# Altium footprint library c3_PcbLib.PcbLib: 222 footprints (part 13 of 14)
Each footprint in its own frame and in the unit in brackets; x right, y up, seen from the top. Pads: shape width x height; smd on the part's side, far side on the other; paste and mask are expansions set on the pad; w line width, h text height; cw(c..) or ccw(c..) is an arc to the next point about the centre after c.
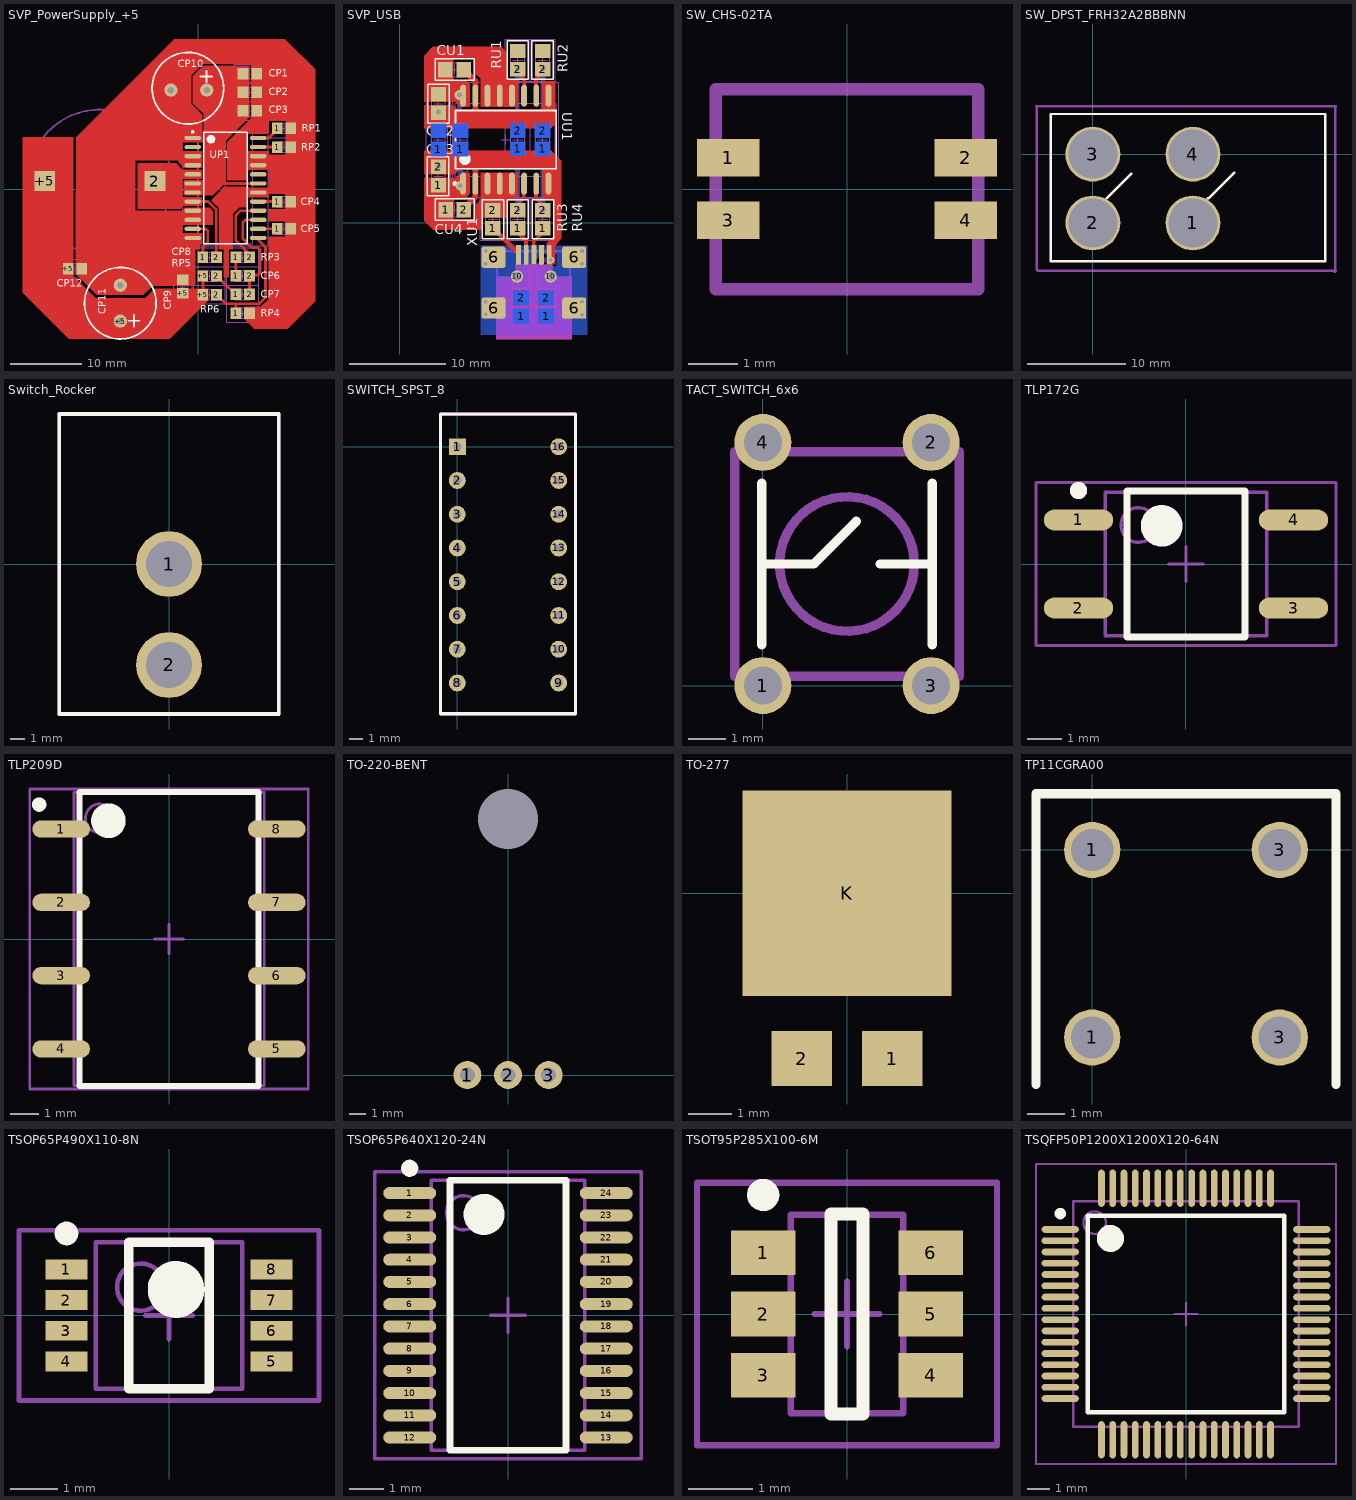
[diagram p12: the footprints below, top view; thin cyan lines are the x and y axes]

## SVP_PowerSupply_+5 [mm]
pads (62):
  rect 1.5x1.6 smd: 1(0.625,-9.474) 1(5.248,-17.272) 1(5.248,-14.656) 1(5.248,-12.065) 1(5.248,-9.474) 1(11.013,-5.512) 1(11.013,-1.702) 1(11.013,5.918) 1(11.013,8.534) 2(2.525,-14.681) 2(2.525,-12.09) 2(2.525,-9.474) 2(7.148,-14.656) 2(7.148,-12.065) 2(7.148,-9.474) +5(-18.171,-11.049) +5(0.625,-14.681) +5(0.625,-12.09) +12P(6.238,10.973) +12P(6.238,13.564) +12P(6.238,16.154) AGND(-16.271,-11.049) AGND(7.148,-17.272) AGND(8.138,10.973) AGND(8.138,13.564) AGND(8.138,16.154) AGND(12.913,-5.512) AGND(12.913,-1.702) AGND(12.913,5.918) AGND(12.913,8.534)
  rect 2.92x2.79 smd: 2(-6.082,1.143) +5(-21.452,1.143)
  oval 2.3x0.6 smd: 2(-0.79,5.918) 5(-0.79,2.108) 8(-0.79,-1.702) 11(-0.79,-5.512) 13(8.36,-6.782) 14(8.36,-5.512) 15(8.36,-4.242) 16(8.36,-2.972) 17(8.36,-1.702) 20(8.36,2.108) 23(8.36,5.918) 24(8.36,7.188) +12P(-0.79,-0.432) +12P(-0.79,0.838) +12P(8.36,0.838) AGND(-0.79,-6.782) AGND(-0.79,-4.242) AGND(-0.79,-2.972) AGND(-0.79,3.378) AGND(-0.79,4.648) AGND(-0.79,7.188) AGND(8.36,-0.432) AGND(8.36,3.378) AGND(8.36,4.648)
  round 1.85 hole 0.9: +5(-10.897,-18.39) +12P(1.168,13.868) AGND(-10.897,-13.39) AGND(-3.832,13.868)
  rect 1.6x1.5 smd: +5(-2.159,-14.514) AGND(-2.159,-12.614)
Top Layer:
  rectangle: 12.167,4.724 16.332,10.185
  region: -17.094,-11.806 -17.094,-7.569 -17.046,7.313 -3.353,21.006 12.09,21.006 16.332,16.789 16.332,9.601 9.83,9.601 9.83,7.925 9.652,7.772 6.909,7.772 6.909,5.334 9.83,5.334 9.83,4.826 16.332,4.826 16.307,-15.646 12.471,-19.482 7.798,-19.482 6.401,-18.085 6.401,-16.408 8.738,-16.408 9.83,-15.316 9.83,-6.604 12.167,-6.604 12.167,-4.445 9.83,-4.445 9.83,-2.769 12.167,-2.769 12.167,-0.635 9.83,-0.635 9.83,-1.118 6.909,-1.118 6.909,-2.515 5.69,-2.515 4.775,-3.429 4.775,-8.382 4.216,-8.382 4.216,-12.294 3.556,-12.294 3.556,-8.382 2.946,-8.382 2.946,-2.616 1.803,-1.499 3.683,0.381 6.909,0.381 6.909,0.254 9.83,0.254 9.83,2.718 6.909,2.718 6.909,1.295 4.064,1.295 4.064,6.604 7.391,9.931 7.391,17.526 0.533,17.526 -1.016,15.977 -1.016,11.938 0.508,10.363 0.508,6.553 -2.286,6.553 -2.286,5.334 0.508,5.334 0.508,3.023 -2.032,3.023 -2.935,4.089 -8.814,4.089 -8.814,-2.972 -2.286,-2.972 -1.905,-2.591 1.575,-2.591 2.032,-3.023 2.032,-4.902 -2.261,-4.902 -2.286,-4.877 -2.286,-6.096 0.508,-6.096 0.508,-7.442 0.203,-7.747 0.203,-8.382 -0.457,-8.382 -0.457,-13.437 -6.375,-13.437 -7.68,-14.694 -12.776,-14.681 -14.166,-14.681
  region: -2.489,-2.692 -2.176,-2.3 0.45,-2.3 0.45,-1.092 -2.286,-1.092 -2.286,1.524 0.508,1.524 0.508,2.769 -2.262,2.769 -2.503,3.012
  region: 7.087,17.272 7.112,10.084 3.81,6.782 3.81,0.991 2.007,-0.813 -2.032,-0.813 -2.032,1.27 0.762,1.27 0.762,10.541 -0.762,12.065 -0.762,15.799 0.66,17.272
  region: -2.464,2.972 -3.124,3.632 -8.433,3.632 -8.433,-2.692 -2.489,-2.692 -2.489,2.946
  region: -17.475,7.315 -24.536,7.315 -24.536,-14.453 -18.136,-20.853 -4.013,-20.853 1.372,-15.469 1.372,-13.894 -6.121,-13.894 -7.442,-15.215 -14.326,-15.215 -17.475,-12.065
  lines w0.254: 6.604,-8.915 6.604,-8.941 6.706,-8.941
  lines w0.381: -0.178,-6.731 -0.102,-6.807 ; -0.178,-5.486 0.965,-5.486 1.321,-5.842 1.321,-7.366 0.66,-8.026 0.66,-9.398 ; -0.051,0.838 8.357,0.838 ; 0.025,-1.676 1.346,-1.676 2.489,-2.819 2.489,-9.398 ; 0.635,-14.707 0.635,-12.116 ; 2.743,-14.91 3.785,-15.951 8.509,-15.951 9.373,-15.088 9.373,-8.077 8.103,-6.807 ; 2.972,-12.471 4.813,-14.313 ; 5.232,-17.196 5.232,-15.951 ; 5.232,-11.963 5.232,-9.728 ; 7.01,-9.068 7.01,-8.915 5.232,-7.137 5.232,-3.607 5.867,-2.972 8.407,-2.972 ; 7.137,-14.605 7.137,-12.421 ; 7.366,-11.963 8.357,-11.963 8.636,-11.684 8.636,-8.433 8.331,-8.128 7.442,-8.128 6.198,-6.883 6.198,-4.597 6.553,-4.242 7.645,-4.242 ; 9.195,-1.702 10.541,-1.702 ; 9.246,-5.512 10.643,-5.512 ; 9.246,5.918 10.668,5.918 ; 9.246,7.188 9.83,7.188 10.77,8.128
Top Overlay:
  circle w0.254: c-1.459,14.122 r5
  circle w0.254: c-10.897,-15.89 r5
  circle w0.6: c1.76,7.003 r0.3
  circle w0.25: c-0.79,8.038 r0.125
  lines w0.2: 0.76,-7.597 6.81,-7.597 6.81,8.003 0.76,8.003 0.76,-7.597
  lines w0.254: -9.779,-18.339 -8.204,-18.339 ; -8.992,-19.152 -8.992,-17.526 ; 0.305,15.773 1.93,15.773 ; 1.118,14.986 1.118,16.561
  text "CP9" at -3.759,-16.789 h1.02
  text "CP1" at 9.83,15.748 h1.02
  text "CP2" at 9.83,13.132 h1.02
  text "CP3" at 9.83,10.617 h1.02
  text "CP4" at 14.326,-2.21 h1.02
  text "CP5" at 14.326,-5.994 h1.02
  text "CP6" at 8.687,-12.522 h1.02
  text "CP7" at 8.687,-15.138 h1.02
  text "CP8" at -3.734,-9.22 h1.02
  text "CP10" at -2.896,17.094 h1.02
  text "CP11" at -12.929,-17.45 h1.02
  text "UP1" at 1.6,4.318 h1.02
  text "RP1" at 14.402,8.077 h1.02
  text "RP2" at 14.376,5.385 h1.02
  text "RP3" at 8.712,-9.957 h1.02
  text "RP4" at 8.738,-17.805 h1.02
  text "RP5" at -3.734,-10.77 h1.02
  text "RP6" at 0.229,-17.196 h1.02
  text "CP12" at -19.812,-13.589 h1.02
Mechanical 13:
  circle w0.1: c0.935,7.053 r0.5
  circle w0.254: c-13.767,1.143 r10
  lines w0.1: -18.321,-11.774 -18.321,-10.324 -16.121,-10.324 -16.121,-11.774 -18.321,-11.774 ; -2.884,-14.664 -2.884,-12.464 -1.434,-12.464 -1.434,-14.664 -2.884,-14.664 ; -0.015,-7.597 7.585,-7.597 7.585,8.003 -0.015,8.003 -0.015,-7.597 ; 0.475,-15.406 0.475,-13.956 2.675,-13.956 2.675,-15.406 0.475,-15.406 ; 0.475,-12.815 0.475,-11.365 2.675,-11.365 2.675,-12.815 0.475,-12.815 ; 0.475,-10.199 0.475,-8.749 2.675,-8.749 2.675,-10.199 0.475,-10.199 ; 5.098,-17.997 5.098,-16.547 7.298,-16.547 7.298,-17.997 5.098,-17.997 ; 5.098,-15.381 5.098,-13.931 7.298,-13.931 7.298,-15.381 5.098,-15.381 ; 5.098,-12.79 5.098,-11.34 7.298,-11.34 7.298,-12.79 5.098,-12.79 ; 5.098,-10.199 5.098,-8.749 7.298,-8.749 7.298,-10.199 5.098,-10.199 ; 6.088,10.248 6.088,11.698 8.288,11.698 8.288,10.248 6.088,10.248 ; 6.088,12.839 6.088,14.289 8.288,14.289 8.288,12.839 6.088,12.839 ; 6.088,15.429 6.088,16.879 8.288,16.879 8.288,15.429 6.088,15.429 ; 10.863,-6.237 10.863,-4.787 13.063,-4.787 13.063,-6.237 10.863,-6.237 ; 10.863,-2.427 10.863,-0.977 13.063,-0.977 13.063,-2.427 10.863,-2.427 ; 10.863,5.193 10.863,6.643 13.063,6.643 13.063,5.193 10.863,5.193 ; 10.863,7.809 10.863,9.259 13.063,9.259 13.063,7.809 10.863,7.809
Mechanical 15:
  lines w0.1: -17.721,-11.049 -16.721,-11.049 ; -17.221,-11.549 -17.221,-10.549 ; -2.659,-13.564 -1.659,-13.564 ; -2.159,-14.064 -2.159,-13.064 ; 1.075,-14.681 2.075,-14.681 ; 1.075,-12.09 2.075,-12.09 ; 1.075,-9.474 2.075,-9.474 ; 1.575,-15.181 1.575,-14.181 ; 1.575,-12.59 1.575,-11.59 ; 1.575,-9.974 1.575,-8.974 ; 3.285,0.203 4.285,0.203 ; 3.785,-0.297 3.785,0.703 ; 5.698,-17.272 6.698,-17.272 ; 5.698,-14.656 6.698,-14.656 ; 5.698,-12.065 6.698,-12.065 ; 5.698,-9.474 6.698,-9.474 ; 6.198,-17.772 6.198,-16.772 ; 6.198,-15.156 6.198,-14.156 ; 6.198,-12.565 6.198,-11.565 ; 6.198,-9.974 6.198,-8.974 ; 6.688,10.973 7.688,10.973 ; 6.688,13.564 7.688,13.564 ; 6.688,16.154 7.688,16.154 ; 7.188,10.473 7.188,11.473 ; 7.188,13.064 7.188,14.064 ; 7.188,15.654 7.188,16.654 ; 11.463,-5.512 12.463,-5.512 ; 11.463,-1.702 12.463,-1.702 ; 11.463,5.918 12.463,5.918 ; 11.463,8.534 12.463,8.534 ; 11.963,-6.012 11.963,-5.012 ; 11.963,-2.202 11.963,-1.202 ; 11.963,5.418 11.963,6.418 ; 11.963,8.034 11.963,9.034 ; -19.421,-12.349 -19.421,-9.749 -15.021,-9.749 -15.021,-12.349 -19.421,-12.349 ; -3.459,-15.764 -3.459,-11.364 -0.859,-11.364 -0.859,-15.764 -3.459,-15.764 ; -2.19,-7.847 9.76,-7.847 9.76,8.253 -2.19,8.253 -2.19,-7.847 ; -0.625,-15.981 -0.625,-13.381 3.775,-13.381 3.775,-15.981 -0.625,-15.981 ; -0.625,-13.39 -0.625,-10.79 3.775,-10.79 3.775,-13.39 -0.625,-13.39 ; -0.625,-10.774 -0.625,-8.174 3.775,-8.174 3.775,-10.774 -0.625,-10.774 ; 3.998,-18.572 3.998,-15.972 8.398,-15.972 8.398,-18.572 3.998,-18.572 ; 3.998,-15.956 3.998,-13.356 8.398,-13.356 8.398,-15.956 3.998,-15.956 ; 3.998,-13.365 3.998,-10.765 8.398,-10.765 8.398,-13.365 3.998,-13.365 ; 3.998,-10.774 3.998,-8.174 8.398,-8.174 8.398,-10.774 3.998,-10.774 ; 4.988,9.673 4.988,12.273 9.388,12.273 9.388,9.673 4.988,9.673 ; 4.988,12.264 4.988,14.864 9.388,14.864 9.388,12.264 4.988,12.264 ; 4.988,14.854 4.988,17.454 9.388,17.454 9.388,14.854 4.988,14.854 ; 9.763,-6.812 9.763,-4.212 14.163,-4.212 14.163,-6.812 9.763,-6.812 ; 9.763,-3.002 9.763,-0.402 14.163,-0.402 14.163,-3.002 9.763,-3.002 ; 9.763,4.618 9.763,7.218 14.163,7.218 14.163,4.618 9.763,4.618 ; 9.763,7.234 9.763,9.834 14.163,9.834 14.163,7.234 9.763,7.234
3D body: height 1.24, standoff -0.03, extent 5.537,15.392 8.839,16.916
3D body: height 1.24, standoff -0.03, extent 5.537,12.802 8.839,14.326
3D body: height 1.24, standoff -0.03, extent 5.537,10.211 8.839,11.735
3D body: height 1.24, standoff -0.03, extent 10.312,-2.464 13.614,-0.94
3D body: height 1.24, standoff -0.03, extent 10.312,-6.274 13.614,-4.75
3D body: height 1.24, standoff -0.03, extent 4.547,-12.827 7.849,-11.303
3D body: height 1.24, standoff -0.03, extent 4.547,-15.418 7.849,-13.894
3D body: height 1.24, standoff -0.03, extent -2.921,-15.215 -1.397,-11.913
3D body: height 0.5, standoff -0.01, extent 10.439,7.772 13.487,9.296
3D body: height 0.5, standoff -0.01, extent 10.439,5.156 13.487,6.68
3D body: height 0.5, standoff -0.01, extent 4.674,-10.236 7.722,-8.712
3D body: height 0.5, standoff -0.01, extent 4.674,-18.034 7.722,-16.51
3D body: height 0.5, standoff -0.01, extent 0.051,-15.443 3.099,-13.919
3D body: height 0.5, standoff -0.01, extent 0.051,-12.852 3.099,-11.328
3D body: height 1.24, standoff -0.03, extent -0.076,-10.236 3.226,-8.712
3D body: height 2.57, standoff -0.03, extent -1.507,-7.595 9.093,8.005
3D body: height 1.24, standoff -0.03, extent -18.872,-11.811 -15.57,-10.287
3D body: height 12.5, standoff 0, extent -15.926,-20.853 -5.918,-10.846
3D body: height 12.5, standoff 0, extent -6.426,9.119 3.581,19.126

## SVP_USB [mm]
pads (57):
  rect 1.6x1.5 smd: 1(4.039,3.901) 1(9.703,-0.594) 1(12.294,-0.594) 1(14.91,-0.594) 2(4.039,5.801) 2(9.703,1.306) 2(12.294,1.306) 2(12.294,15.966) 2(14.884,15.966) 2(14.91,1.306) +3.3D(4.039,13.345) DGND(4.039,11.445) USB_N(12.294,17.866) USB_P(14.884,17.866)
  rect 1.6x1.5 smd far side: 1(4.039,7.661) 1(6.325,7.661) 1(12.294,7.686) 1(12.649,-9.738) 1(14.884,7.686) 1(15.24,-9.738) 2(12.294,9.586) 2(12.649,-7.838) 2(14.884,9.586) 2(15.24,-7.838) +3.3D(6.325,9.561) DGND(4.039,9.561)
  rect 1.5x1.6 smd: 1(4.79,1.346) 2(6.69,1.346) +3.3D(4.765,15.926) DGND(6.665,15.926)
  oval 0.6x2.3 smd: 1(6.604,4.061) 2(7.874,4.061) 3(9.144,4.061) 4(10.414,4.061) 5(11.684,4.061) 6(12.954,4.061) 7(14.224,4.061) 8(15.494,4.061) 10(14.224,13.211) 11(12.954,13.211) +3.3D(6.604,13.211) +3.3D(9.144,13.211) +3.3D(10.414,13.211) +3.3D(11.684,13.211) DGND(7.874,13.211) DGND(15.494,13.211)
  rect 0.5x2 smd: 1(12.37,-3.353) 2(13.17,-3.353) 3(13.97,-3.353) 4(14.77,-3.353) 5(15.57,-3.353)
  rrect20% 2.5x2.2 smd: 6(9.77,-8.903) 6(9.77,-3.603) 6(18.17,-8.903) 6(18.17,-3.603)
  round 1.27 hole 0.9: 10(12.22,-5.603) 10(15.72,-5.603)
via 6.223,13.284 diameter 1.016 hole 0.508
via 8.966,-2.946 diameter 0.762 hole 0.381
via 8.941,-4.293 diameter 0.762 hole 0.381
via 8.941,-8.23 diameter 0.762 hole 0.381
via 8.966,-9.55 diameter 0.762 hole 0.381
via 18.974,-9.576 diameter 0.762 hole 0.381
via 18.974,-8.23 diameter 0.762 hole 0.381
via 18.974,-4.267 diameter 0.762 hole 0.381
via 18.974,-2.946 diameter 0.762 hole 0.381
via 15.723,-3.886 diameter 0.762 hole 0.381
via 12.243,15.977 diameter 1.016 hole 0.508
via 14.91,15.977 diameter 1.016 hole 0.508
via 12.294,1.295 diameter 1.016 hole 0.508
via 14.91,1.321 diameter 1.016 hole 0.508
via 6.299,3.835 diameter 1.016 hole 0.508
via 4.039,5.893 diameter 1.016 hole 0.508
via 4.039,11.506 diameter 1.016 hole 0.508
Top Layer:
  region: 2.565,4.674 5.867,4.674 6.401,5.207 7.29,5.207 7.29,2.997 6.731,2.438 5.613,2.438 5.613,0.279 7.696,0.279 7.696,1.626 8.458,2.388 8.458,5.207 12.344,5.207 12.344,2.642 12.014,2.311 11.201,2.311 11.201,0.483 8.636,0.483 8.636,-0.762 3.531,-0.787 2.565,0.178
  region: 2.54,5.029 5.715,5.029 6.223,5.537 14.834,5.537 14.834,2.676 15.18,2.311 15.977,2.311 15.977,-1.448 15.291,-2.159 15.291,-4.343 16.18,-4.343 16.18,-2.413 16.84,-1.651 16.84,6.426 15.773,7.493 2.54,7.493
  region: 7.29,12.065 6.325,12.065 5.817,12.573 2.54,12.573 2.54,17.374 3.454,18.313 10.566,18.313 11.201,17.602 11.201,14.961 12.141,14.961 12.344,14.757 12.344,12.065 8.458,12.065 8.458,14.986 7.722,15.723 7.722,17.069 5.588,17.069 5.588,14.834 6.934,14.834 7.29,14.478
  region: 2.54,12.217 5.588,12.217 6.071,11.735 14.808,11.76 14.808,14.707 16.18,14.707 16.18,10.222 15.748,9.804 2.54,9.804
  lines w0.381: 12.167,-0.864 13.157,-1.854 13.157,-2.642 ; 12.344,1.956 12.929,2.54 12.929,3.353 ; 12.421,15.443 12.954,14.91 12.954,13.995 ; 13.97,-2.921 13.97,-1.93 14.935,-0.965 ; 14.199,3.454 14.199,2.54 14.961,1.778 ; 14.199,13.894 14.199,14.91 15.037,15.748
  lines w0.508: 9.906,-0.762 11.989,-2.845 12.319,-2.845
  lines w0.635: 6.807,15.799 7.874,14.732 7.874,10.744 ; 7.087,1.88 7.874,2.667 7.874,5.969
Bottom Layer:
  region: 8.433,-2.413 8.433,-11.684 19.507,-11.684 19.507,-2.413 16.358,-2.413 16.358,-4.521 15.138,-4.521 14.453,-5.207 14.453,-6.833 16.307,-6.833 16.307,-8.89 11.582,-8.89 11.582,-6.833 13.437,-6.833 13.437,-4.648 14.834,-3.251 16.358,-3.251 16.358,-2.413
  lines w0.508: 4.039,5.893 4.039,7.849 ; 4.039,9.55 4.039,11.506 ; 6.223,9.271 6.223,13.259 ; 6.299,3.835 6.299,7.722 ; 12.243,9.576 12.243,15.977 ; 12.268,1.295 12.268,7.823 ; 13.945,-7.823 13.945,-4.953 15.037,-3.861 15.723,-3.861 ; 14.91,1.321 14.91,7.823 ; 14.91,9.677 14.91,15.977
  lines w1.27: 12.598,-7.823 15.215,-7.823
Top Overlay:
  circle w0.25: c5.754,4.061 r0.125
  circle w0.6: c6.799,6.611 r0.3
  lines w0.152: 2.896,2.819 5.131,2.819 5.131,6.858 2.896,6.858 2.896,2.819 ; 2.921,10.363 5.156,10.363 5.156,14.402 2.921,14.402 2.921,10.363 ; 3.708,0.229 7.747,0.229 7.747,2.464 3.708,2.464 3.708,0.229 ; 3.708,14.808 3.708,17.043 7.747,17.043 7.747,14.808 3.708,14.808 ; 8.585,-1.676 10.82,-1.676 10.82,2.362 8.585,2.362 8.585,-1.676 ; 11.176,-1.676 13.411,-1.676 13.411,2.362 11.176,2.362 11.176,-1.676 ; 11.176,14.91 13.411,14.91 13.411,18.948 11.176,18.948 11.176,14.91 ; 13.741,14.91 15.977,14.91 15.977,18.948 13.741,18.948 13.741,14.91 ; 13.792,-1.676 16.027,-1.676 16.027,2.362 13.792,2.362 13.792,-1.676
  lines w0.2: 5.799,5.611 16.299,5.611 16.299,11.661 5.799,11.661 5.799,5.611
  text "RU1" at 10.592,16.002 h1.02
  text "RU2" at 17.501,15.646 h1.02
  text "RU3" at 17.45,-0.965 h1.02
  text "RU4" at 18.999,-0.94 h1.02
  text "CU1" at 3.861,17.45 h1.02
  text "CU2" at 2.743,9.042 h1.02
  text "CU4" at 3.658,-1.219 h1.02
  text "CU3" at 2.743,7.137 h1.02
  text "XU1" at 8.077,-2.438 h1.02
  text "UU1" at 16.942,11.481 h1.02
Bottom Overlay:
  lines w0.152: 5.182,6.579 7.417,6.579 7.417,10.617 5.182,10.617 ; 5.182,6.579 5.182,10.617 ; 5.182,6.579 2.946,6.579 2.946,10.617 5.182,10.617 ; 5.182,6.579 5.182,10.617 ; 11.176,6.604 13.411,6.604 13.411,10.643 11.176,10.643 11.176,6.604 ; 11.506,-10.846 13.741,-10.846 13.741,-6.807 11.506,-6.807 11.506,-10.846 ; 13.767,6.604 16.002,6.604 16.002,10.643 13.767,10.643 13.767,6.604 ; 14.122,-10.846 16.358,-10.846 16.358,-6.807 14.122,-6.807 14.122,-10.846
  text "RU5" at 2.565,10.008 h1.02
  text "RU6" at 8.712,10.084 h1.02
  text "RU7" at 10.77,10.084 h1.02
  text "RU8" at 17.374,10.109 h1.02
  text "CU7" at 16.637,-10.363 h1.02
  text "RU9" at 10.058,-10.236 h1.02
Mechanical 13:
  circle w0.1: c6.749,5.786 r0.5
  lines w0.1: 3.314,3.751 3.314,5.951 4.764,5.951 4.764,3.751 3.314,3.751 ; 3.314,7.511 4.764,7.511 4.764,9.711 3.314,9.711 3.314,7.511 ; 3.314,11.295 3.314,13.495 4.764,13.495 4.764,11.295 3.314,11.295 ; 4.615,15.201 4.615,16.651 6.815,16.651 6.815,15.201 4.615,15.201 ; 4.64,0.621 6.84,0.621 6.84,2.071 4.64,2.071 4.64,0.621 ; 5.6,7.511 5.6,9.711 7.05,9.711 7.05,7.511 5.6,7.511 ; 5.799,4.836 16.299,4.836 16.299,12.436 5.799,12.436 5.799,4.836 ; 8.978,-0.744 8.978,1.456 10.428,1.456 10.428,-0.744 8.978,-0.744 ; 11.569,-0.744 11.569,1.456 13.019,1.456 13.019,-0.744 11.569,-0.744 ; 11.569,7.536 11.569,9.736 13.019,9.736 13.019,7.536 11.569,7.536 ; 11.569,15.816 11.569,18.016 13.019,18.016 13.019,15.816 11.569,15.816 ; 11.924,-9.888 11.924,-7.688 13.374,-7.688 13.374,-9.888 11.924,-9.888 ; 14.159,7.536 14.159,9.736 15.609,9.736 15.609,7.536 14.159,7.536 ; 14.159,15.816 14.159,18.016 15.609,18.016 15.609,15.816 14.159,15.816 ; 14.185,-0.744 14.185,1.456 15.635,1.456 15.635,-0.744 14.185,-0.744 ; 14.515,-9.888 14.515,-7.688 15.965,-7.688 15.965,-9.888 14.515,-9.888
  lines w0.254: 10.16,-11.989 17.78,-11.989 17.78,-2.972 10.16,-2.972 10.16,-11.989
Mechanical 15:
  lines w0.1: 2.739,6.411 5.339,6.411 5.339,10.811 2.739,10.811 ; 2.739,10.195 5.339,10.195 5.339,14.595 2.739,14.595 ; 2.748,2.651 2.748,7.051 ; 2.748,6.411 2.748,10.811 ; 2.748,10.195 2.748,14.595 ; 3.539,4.851 4.539,4.851 ; 3.539,8.611 4.539,8.611 ; 3.539,12.395 4.539,12.395 ; 4.039,4.351 4.039,5.351 ; 4.039,8.111 4.039,9.111 ; 4.039,11.895 4.039,12.895 ; 5.025,6.411 5.025,10.811 ; 5.215,15.926 6.215,15.926 ; 5.24,1.346 6.24,1.346 ; 5.715,15.426 5.715,16.426 ; 5.74,0.846 5.74,1.846 ; 5.825,8.611 6.825,8.611 ; 6.325,8.111 6.325,9.111 ; 9.203,0.356 10.203,0.356 ; 9.703,-0.144 9.703,0.856 ; 10.549,8.636 11.549,8.636 ; 11.049,8.136 11.049,9.136 ; 11.794,0.356 12.794,0.356 ; 11.794,8.636 12.794,8.636 ; 11.794,16.916 12.794,16.916 ; 12.149,-8.788 13.149,-8.788 ; 12.294,-0.144 12.294,0.856 ; 12.294,8.136 12.294,9.136 ; 12.294,16.416 12.294,17.416 ; 12.649,-9.288 12.649,-8.288 ; 14.384,8.636 15.384,8.636 ; 14.384,16.916 15.384,16.916 ; 14.41,0.356 15.41,0.356 ; 14.74,-8.788 15.74,-8.788 ; 14.884,8.136 14.884,9.136 ; 14.884,16.416 14.884,17.416 ; 14.91,-0.144 14.91,0.856 ; 15.24,-9.288 15.24,-8.288 ; 2.739,2.651 2.739,7.051 5.339,7.051 5.339,2.651 2.739,2.651 ; 3.515,14.626 3.515,17.226 7.915,17.226 7.915,14.626 3.515,14.626 ; 3.54,0.046 7.94,0.046 7.94,2.646 3.54,2.646 3.54,0.046 ; 5.549,2.661 16.549,2.661 16.549,14.611 5.549,14.611 5.549,2.661 ; 8.403,-1.844 8.403,2.556 11.003,2.556 11.003,-1.844 8.403,-1.844 ; 10.994,-1.844 10.994,2.556 13.594,2.556 13.594,-1.844 10.994,-1.844 ; 10.994,6.436 10.994,10.836 13.594,10.836 13.594,6.436 10.994,6.436 ; 10.994,14.716 10.994,19.116 13.594,19.116 13.594,14.716 10.994,14.716 ; 11.349,-10.988 11.349,-6.588 13.949,-6.588 13.949,-10.988 11.349,-10.988 ; 13.584,6.436 13.584,10.836 16.184,10.836 16.184,6.436 13.584,6.436 ; 13.584,14.716 13.584,19.116 16.184,19.116 16.184,14.716 13.584,14.716 ; 13.61,-1.844 13.61,2.556 16.21,2.556 16.21,-1.844 13.61,-1.844 ; 13.94,-10.988 13.94,-6.588 16.54,-6.588 16.54,-10.988 13.94,-10.988
Mechanical 15 keep-out:
  region: 12.065,-4.369 15.875,-4.369 15.875,-5.639 17.907,-5.639 17.907,-12.116 10.033,-12.116 10.033,-5.639 12.065,-5.639
3D body: height 2.57, standoff -0.03, extent 5.842,3.336 16.342,13.936
3D body: height 0.5, standoff -0.01, extent 8.941,-1.168 10.465,1.88
3D body: height 0.5, standoff -0.01, extent 11.887,-10.262 13.411,-7.214
3D body: height 0.5, standoff -0.01, extent 5.563,7.087 7.087,10.135
3D body: height 0.5, standoff -0.01, extent 3.277,7.087 4.801,10.135
3D body: height 0.5, standoff -0.01, extent 11.532,7.112 13.056,10.16
3D body: height 0.5, standoff -0.01, extent 14.122,7.112 15.646,10.16
3D body: height 0.5, standoff -0.01, extent 11.532,15.392 13.056,18.44
3D body: height 0.5, standoff -0.01, extent 14.122,15.392 15.646,18.44
3D body: height 0.5, standoff -0.01, extent 11.532,-1.168 13.056,1.88
3D body: height 0.5, standoff -0.01, extent 14.148,-1.168 15.672,1.88
3D body: height 1.24, standoff -0.03, extent 14.503,-10.541 16.027,-7.239
3D body: height 1.24, standoff -0.03, extent 4.089,0.584 7.391,2.108
3D body: height 1.24, standoff -0.03, extent 4.064,15.164 7.366,16.688
3D body: height 1.24, standoff -0.03, extent 3.277,3.2 4.801,6.502
3D body: height 1.24, standoff -0.03, extent 3.277,10.744 4.801,14.046
3D body: height 4.12, standoff -0.97, extent 8.998,-11.839 18.898,-2.639

## SW_CHS-02TA [mil]
pads (4):
  rect 50x30 smd: 1(-95,25) 2(95,25) 3(-95,-25) 4(95,-25)
Mechanical 13:
  lines w10: -105,-80 105,-80 105,80 -105,80 -105,-80
3D body: height 98.43, standoff 0, extent -104.98,-79.98 104.98,79.98

## SW_DPST_FRH32A2BBBNN [mil]
pads (4):
  round 220 hole 197: 1(402,-276) 2(0,-276) 3(0,0) 4(402,0)
Top Overlay:
  lines w10: 55.12,-177.17 153.54,-78.74 ; 460.63,-177.17 464.57,-177.17 566.93,-74.8 ; -169.29,-429.13 -169.29,161.42 -153.54,161.42 933.07,161.42 933.07,-429.13 -169.29,-429.13
Mechanical 15:
  lines w10: -228.35,192.91 -177.17,192.91 ; -224.41,192.91 -224.41,-464.57 -220.47,-468.5 618.11,-468.5 ; -188.98,192.91 618.11,192.91 ; 602.36,-468.5 976.38,-468.5 ; 602.36,192.91 976.38,192.91 972.44,188.98 972.44,-472.44 968.5,-468.5

## Switch_Rocker [mil]
pads (2):
  round 180 hole 125: 1(0,0) 2(0,-276)
Top Overlay:
  lines w10: -300,-410 -300,410 300,410 300,-410 -300,-410
Mechanical 13:
  lines w10: -300,-410 300,-410 300,410 -300,410 -300,-410
3D body: height 600, standoff 0, extent -299.98,-409.98 299.98,409.98

## SWITCH_SPST_8 [mm]
pads (16):
  rect 1.27x1.27 hole 0.635: 1(0,0)
  round 1.27 hole 0.635: 2(0,-2.54) 3(0,-5.08) 4(0,-7.62) 5(0,-10.16) 6(0,-12.7) 7(0,-15.24) 8(0,-17.78) 9(7.62,-17.78) 10(7.62,-15.24) 11(7.62,-12.7) 12(7.62,-10.16) 13(7.62,-7.62) 14(7.62,-5.08) 15(7.62,-2.54) 16(7.62,0)
Top Overlay:
  lines w0.254: -1.27,-20.091 -1.27,2.464 8.89,2.464 8.89,-20.091 -1.27,-20.091
Mechanical 13:
  lines w0.254: -1.27,-20.117 8.89,-20.117 8.89,2.438 -1.27,2.438 -1.27,-20.117
3D body: height 8.89, standoff 0, extent -0.991,-20.041 8.661,2.438

## TACT_SWITCH_6x6 [mil]
pads (4):
  round 60 hole 40: 1(0,0) 2(177.17,255.91) 3(177.17,0) 4(0,255.91)
Top Overlay:
  lines w10: -1.42,42.95 -1.42,212.95 ; -1.42,127.95 53.58,127.95 98.58,172.95 ; 123.58,127.95 178.58,127.95 ; 178.58,42.95 178.58,212.95
Mechanical 13:
  circle w10: c88.58,127.95 r70.87
  lines w10: -29.53,9.84 -29.53,246.06 206.69,246.06 206.69,9.84 -29.53,9.84
3D body: height 169, standoff -25, extent -29,0 207,255.39

## TLP172G [mm] "SOP, 4-Leads, Body 4.2x4.7mm (max), Pitch 2.54mm, IPC Medium Density"
height 2.1
pads (4):
  oval 2x0.6 smd: 1(-3.1,1.27) 2(-3.1,-1.27) 3(3.1,-1.27) 4(3.1,1.27)
Top Overlay:
  circle w0.25: c-3.1,2.12 r0.125
  circle w0.6: c-0.7,1.1 r0.3
  lines w0.2: -1.7,-2.1 -1.7,2.1 1.7,2.1 1.7,-2.1 -1.7,-2.1
Mechanical 13:
  circle w0.1: c-1.375,1.125 r0.5
  lines w0.1: -2.325,-2.075 -2.325,2.075 2.325,2.075 2.325,-2.075 -2.325,-2.075
Mechanical 15:
  lines w0.1: -0.5,0 0.5,0 ; 0,-0.5 0,0.5 ; -4.325,-2.35 -4.325,2.35 4.325,2.35 4.325,-2.35 -4.325,-2.35
3D body: height 2.1, standoff 0.1, extent -2.325,-2.075 2.325,2.075

## TLP209D [mm]
pads (8):
  oval 2x0.6 smd: 1(-3.738,3.81) 2(-3.738,1.27) 3(-3.738,-1.27) 4(-3.738,-3.81) 5(3.738,-3.81) 6(3.738,-1.27) 7(3.738,1.27) 8(3.738,3.81)
Top Overlay:
  circle w0.6: c-2.1,4.1 r0.3
  circle w0.25: c-4.5,4.66 r0.125
  lines w0.2: -3.1,-5.1 3.1,-5.1 3.1,5.1 -3.1,5.1 -3.1,-5.1
Mechanical 13:
  circle w0.1: c-2.4,4.18 r0.5
  lines w0.1: -3.3,-5.08 3.3,-5.08 3.3,5.08 -3.3,5.08 -3.3,-5.08
Mechanical 15:
  lines w0.1: -0.5,0 0.5,0 ; 0,-0.5 0,0.5 ; -4.826,-5.2 4.826,-5.2 4.826,5.2 -4.826,5.2 -4.826,-5.2
3D body: height 4.57, standoff 0, extent -3.3,-5.08 3.3,5.08

## TO-220-BENT [mm]
pads (4):
  round 1.75 hole 0.95: 1(-2.54,0) 2(0,0) 3(2.54,0)
  round 0 hole 3.75: 7(0,16)
3D body: height 4.2, standoff -3, extent -5.105,-0.22 5.055,19.27

## TO-277 [mm]
pads (3):
  rect 1.4x1.27 smd: 1(1.04,-3.805) 2(-1.04,-3.805)
  rect 4.8x4.72 smd: K(0,0)

## TP11CGRA00 [mil] "OFF-MOM PB"
pads (4):
  round 60 hole 45: 1(0,-200) 1(0,0) 3(200,-200) 3(200,0)
Top Overlay:
  lines w10: -60,-250 -60,60 260,60 260,-250

## TSOP65P490X110-8N [mm] "TSOP, 8-Leads, Body 3.1x3.1mm (max), Pitch 0.65mm, IPC Medium Density"
height 1.1
pads (8):
  rect 0.889x0.42 smd: 1(-2.171,0.975) 2(-2.171,0.325) 3(-2.171,-0.325) 4(-2.171,-0.975) 5(2.17,-0.975) 6(2.17,-0.325) 7(2.17,0.325) 8(2.17,0.975)
Top Overlay:
  circle w0.6: c0.15,0.55 r0.3
  circle w0.25: c-2.171,1.735 r0.125
  lines w0.2: -0.85,-1.55 0.85,-1.55 0.85,1.55 -0.85,1.55 -0.85,-1.55
Mechanical 13:
  circle w0.1: c-0.6,0.6 r0.5
  lines w0.1: -1.55,-1.55 1.55,-1.55 1.55,1.55 -1.55,1.55 -1.55,-1.55
Mechanical 15:
  lines w0.1: -0.5,0 0.5,0 ; 0,-0.5 0,0.5 ; -3.175,-1.8 3.175,-1.8 3.175,1.8 -3.175,1.8 -3.175,-1.8
3D body: height 1.1, standoff 0.05, extent -1.55,-1.55 1.55,1.55

## TSOP65P640X120-24N [mm] "TSOP, 24-Leads, Body 7.9x4.5mm (max), Pitch 0.65mm, IPC Medium Density"
height 1.2
pads (24):
  oval 1.55x0.35 smd: 1(-2.875,3.575) 2(-2.875,2.925) 3(-2.875,2.275) 4(-2.875,1.625) 5(-2.875,0.975) 6(-2.875,0.325) 7(-2.875,-0.325) 8(-2.875,-0.975) 9(-2.875,-1.625) 10(-2.875,-2.275) 11(-2.875,-2.925) 12(-2.875,-3.575) 13(2.875,-3.575) 14(2.875,-2.925) 15(2.875,-2.275) 16(2.875,-1.625) 17(2.875,-0.975) 18(2.875,-0.325) 19(2.875,0.325) 20(2.875,0.975) 21(2.875,1.625) 22(2.875,2.275) 23(2.875,2.925) 24(2.875,3.575)
Top Overlay:
  circle w0.6: c-0.7,2.95 r0.3
  circle w0.25: c-2.875,4.3 r0.125
  lines w0.2: -1.7,-3.95 1.7,-3.95 1.7,3.95 -1.7,3.95 -1.7,-3.95
Mechanical 13:
  circle w0.1: c-1.3,3 r0.5
  lines w0.1: -2.25,-3.95 2.25,-3.95 2.25,3.95 -2.25,3.95 -2.25,-3.95
Mechanical 15:
  lines w0.1: -0.5,0 0.5,0 ; 0,-0.5 0,0.5 ; -3.9,-4.2 3.9,-4.2 3.9,4.2 -3.9,4.2 -3.9,-4.2
3D body: height 1.2, standoff 0.05, extent -2.25,-3.95 2.25,3.95

## TSOT95P285X100-6M [mm] "TSOT23, 6-Leads, Body 3.1x2.8mm (max), Pitch 0.95mm, IPC Low Density"
height 1
pads (6):
  rect 1x0.69 smd: 1(-1.3,0.95) 2(-1.3,0) 3(-1.3,-0.95) 4(1.3,-0.95) 5(1.3,0) 6(1.3,0.95)
Top Overlay:
  circle w0.25: c-1.3,1.845 r0.125
  lines w0.2: -0.25,-1.55 0.25,-1.55 0.25,1.55 -0.25,1.55 -0.25,-1.55
Mechanical 13:
  lines w0.1: -0.875,-1.535 0.875,-1.535 0.875,1.535 -0.875,1.535 -0.875,-1.535
Mechanical 15:
  lines w0.1: -0.5,0 0.5,0 ; 0,-0.5 0,0.5 ; -2.325,-2.035 -2.325,2.035 2.325,2.035 2.325,-2.035 -2.325,-2.035
3D body: height 0.86, standoff 0, extent -1.405,-1.5 1.405,1.5

## TSQFP50P1200X1200X120-64N [mm] "TSQFP, 64-Leads, Body 12.0x12.0mm (max), Pitch 0.50mm, IPC Medium Density"
height 1.2
pads (64):
  oval 1.65x0.3 smd: 1(-5.575,3.75) 2(-5.575,3.25) 3(-5.575,2.75) 4(-5.575,2.25) 5(-5.575,1.75) 6(-5.575,1.25) 7(-5.575,0.75) 8(-5.575,0.25) 9(-5.575,-0.25) 10(-5.575,-0.75) 11(-5.575,-1.25) 12(-5.575,-1.75) 13(-5.575,-2.25) 14(-5.575,-2.75) 15(-5.575,-3.25) 16(-5.575,-3.75) 33(5.575,-3.75) 34(5.575,-3.25) 35(5.575,-2.75) 36(5.575,-2.25) 37(5.575,-1.75) 38(5.575,-1.25) 39(5.575,-0.75) 40(5.575,-0.25) 41(5.575,0.25) 42(5.575,0.75) 43(5.575,1.25) 44(5.575,1.75) 45(5.575,2.25) 46(5.575,2.75) 47(5.575,3.25) 48(5.575,3.75)
  oval 0.3x1.65 smd: 17(-3.75,-5.575) 18(-3.25,-5.575) 19(-2.75,-5.575) 20(-2.25,-5.575) 21(-1.75,-5.575) 22(-1.25,-5.575) 23(-0.75,-5.575) 24(-0.25,-5.575) 25(0.25,-5.575) 26(0.75,-5.575) 27(1.25,-5.575) 28(1.75,-5.575) 29(2.25,-5.575) 30(2.75,-5.575) 31(3.25,-5.575) 32(3.75,-5.575) 49(3.75,5.575) 50(3.25,5.575) 51(2.75,5.575) 52(2.25,5.575) 53(1.75,5.575) 54(1.25,5.575) 55(0.75,5.575) 56(0.25,5.575) 57(-0.25,5.575) 58(-0.75,5.575) 59(-1.25,5.575) 60(-1.75,5.575) 61(-2.25,5.575) 62(-2.75,5.575) 63(-3.25,5.575) 64(-3.75,5.575)
Top Overlay:
  circle w0.25: c-5.575,4.45 r0.125
  circle w0.6: c-3.35,3.35 r0.3
  lines w0.2: -4.35,-4.35 -4.35,4.35 4.35,4.35 4.35,-4.35 -4.35,-4.35
Mechanical 13:
  circle w0.1: c-4.05,4.05 r0.5
  lines w0.1: -5,-5 -5,5 5,5 5,-5 -5,-5
Mechanical 15:
  lines w0.1: -0.5,0 0.5,0 ; 0,-0.5 0,0.5 ; -6.65,-6.65 -6.65,6.65 6.65,6.65 6.65,-6.65 -6.65,-6.65
3D body: height 1, standoff 0, extent -5.791,-5.787 5.79,5.787